# Altium footprint library 封装库.PcbLib: 755 footprints (part 26 of 48)
Each footprint in its own frame and in the unit in brackets; x right, y up, seen from the top. Pads: shape width x height; smd on the part's side, far side on the other; paste and mask are expansions set on the pad; w line width, h text height; cw(c..) or ccw(c..) is an arc to the next point about the centre after c.
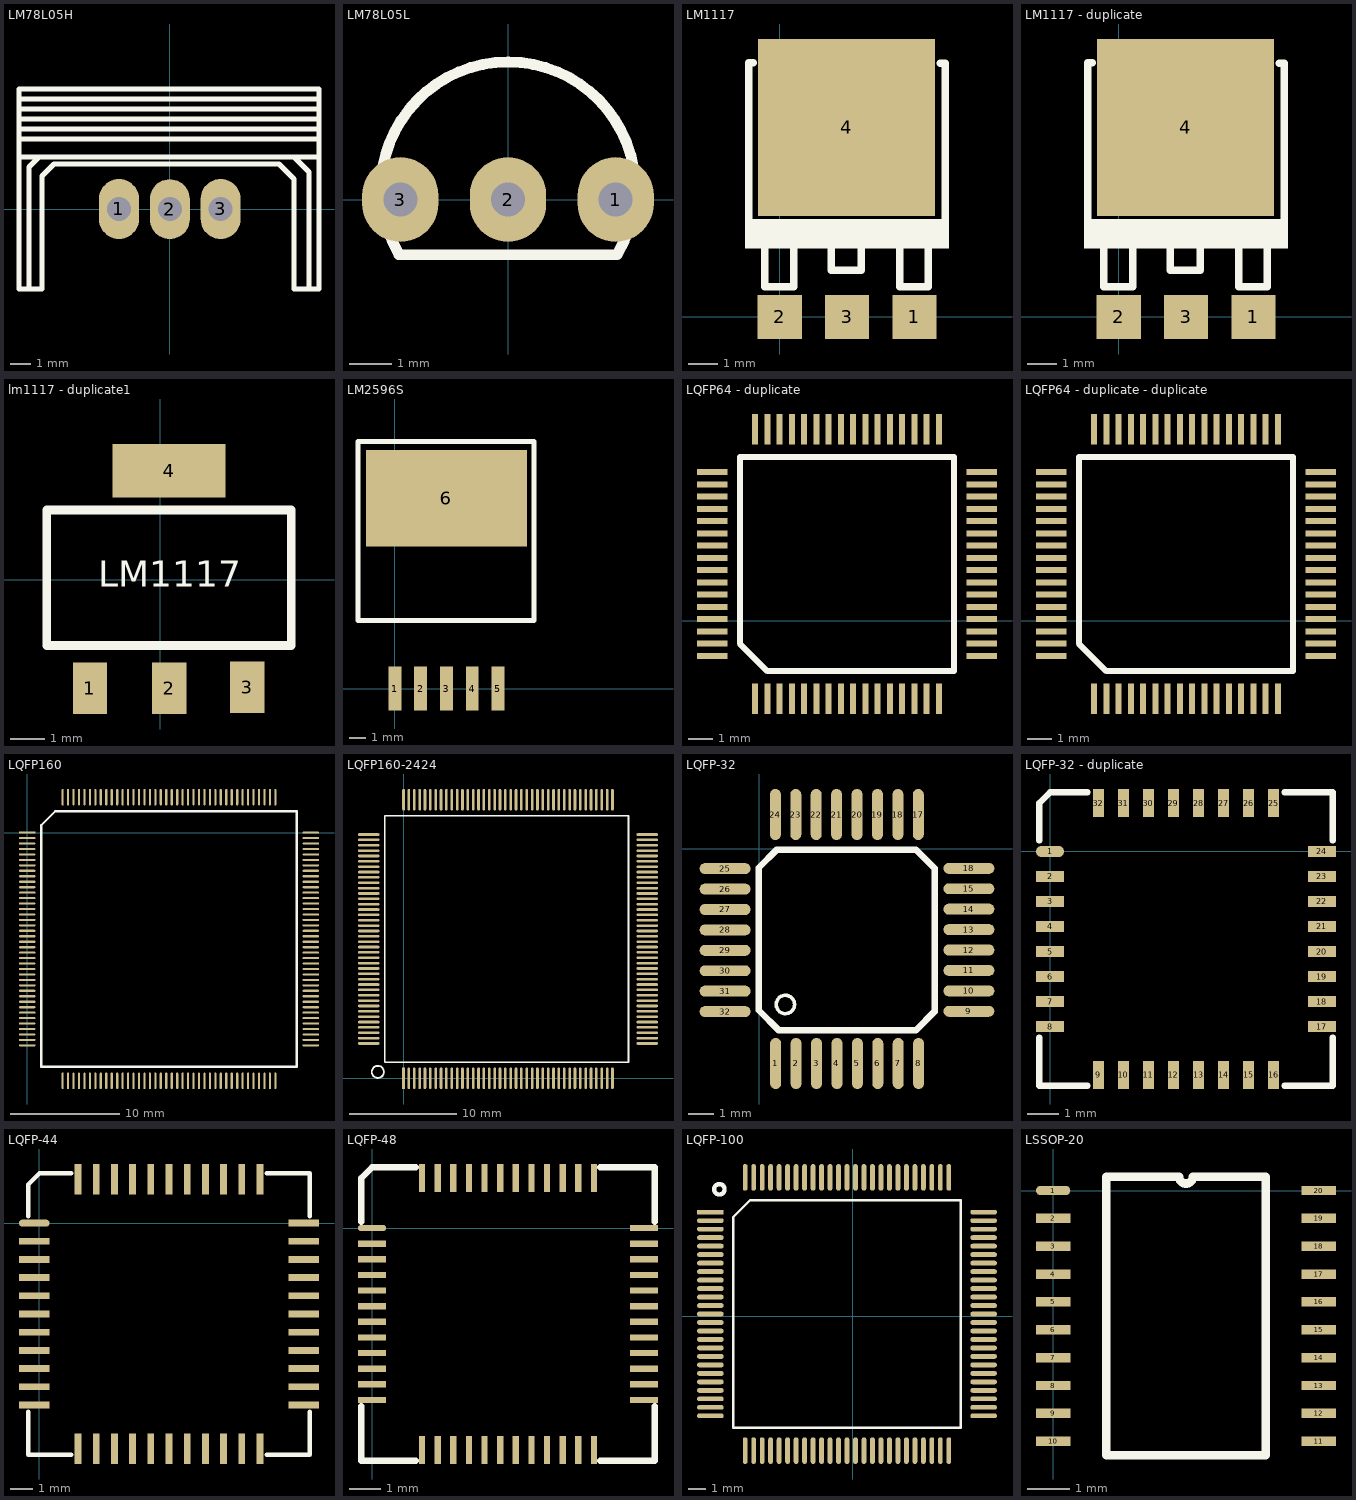
[diagram p25: the footprints below, top view; thin cyan lines are the x and y axes]

## LM78L05H [mm]
pads (3):
  oval 2x3 hole 1.2: 1(-2.544,0.006) 2(0,0) 3(2.536,0.006)
Top Overlay:
  lines w0.254: -7.544,2.61 7.456,2.61 ; -7.544,3.506 7.456,3.506 ; -7.544,4.006 7.456,4.006 ; -7.544,4.506 7.456,4.506 ; -7.544,5.006 7.456,5.006 ; -7.544,5.506 7.456,5.506 ; -7.044,-3.994 -7.044,2.11 -6.544,2.61 ; 6.206,2.61 6.956,1.86 6.956,-3.994 ; -7.544,-3.994 -7.544,6.006 7.456,6.006 7.456,-3.994 6.206,-3.994 6.206,1.506 5.456,2.256 -5.794,2.256 -6.392,1.658 -6.392,-3.994 -7.544,-3.994

## LM78L05L [mm]
pads (3):
  oval 1.8x2 hole 0.8: 1(2.54,0) 2(0,0) 3(-2.54,0)
Top Overlay:
  lines w0.254: -2.594,-1.25 cw(c0.004,0.25) 2.602,-1.25 ; -2.576,-1.3 2.574,-1.3

## LM1117 [mm]
pads (4):
  rect 1.5x1.5 smd: 1(4.572,0) 2(0,0) 3(2.286,0)
  rect 6x6 smd: 4(2.272,6.425)
Top Overlay:
  rectangle: -1.178,2.325 5.747,3.325
  lines w0.254: -1.053,3.15 -1.053,8.625 ; -1.028,8.625 -0.903,8.625 ; -0.503,2.275 -0.503,1.025 0.472,1.025 0.472,2.3 ; 1.747,2.275 1.747,1.575 2.772,1.575 2.772,2.375 ; 4.072,2.275 4.072,1.025 5.047,1.025 5.047,2.3 ; 5.447,8.6 5.597,8.6 ; 5.622,3.175 5.622,8.6

## LM1117 - duplicate [mm]
height 12.93
pads (4):
  rect 1.5x1.5 smd: 1(4.572,0) 2(0,0) 3(2.286,0)
  rect 6x6 smd: 4(2.272,6.425)
Top Overlay:
  rectangle: -1.178,2.325 5.747,3.325
  lines w0.254: -1.053,3.15 -1.053,8.625 ; -1.028,8.625 -0.903,8.625 ; -0.503,2.275 -0.503,1.025 0.472,1.025 0.472,2.3 ; 1.747,2.275 1.747,1.575 2.772,1.575 2.772,2.375 ; 4.072,2.275 4.072,1.025 5.047,1.025 5.047,2.3 ; 5.447,8.6 5.597,8.6 ; 5.622,3.175 5.622,8.6

## lm1117 - duplicate1 [mm]
pads (4):
  rect 1x1.5 smd: 1(-2.043,-3.148) 2(0.256,-3.148) 3(2.53,-3.123)
  rect 3.3x1.549 smd: 4(0.254,3.175)
Top Overlay:
  lines w0.254: -3.302,-1.905 3.81,-1.905 3.81,2.032 -3.302,2.032 -3.302,-1.905
  text "LM1117" at -1.8,-0.2 h0.76

## LM2596S [mm]
pads (6):
  rect 0.8x2.7 smd: 1(0,0) 2(1.6,0) 3(3.2,0) 4(4.8,0) 5(6.4,0)
  rect 10x6 smd: 6(3.2,11.8)
Top Overlay:
  lines w0.305: -2.286,4.208 -2.286,15.333 8.636,15.333 8.636,4.208 -2.286,4.208
Bottom Paste:
  lines w0.254: 6.328,2.091 16.328,2.091 16.328,6.391 6.328,6.391 6.328,2.091
Multi-Layer:
  text "Comment" at -1.927,15.003 h0.64

## LQFP64 - duplicate [mil]
pads (64):
  rect 10x50 smd: 1(848.22,-127.07) 2(868.22,-127.07) 3(888.22,-127.07) 4(908.22,-127.07) 5(928.22,-127.07) 6(948.22,-127.07) 7(968.22,-127.07) 8(988.22,-127.07) 9(1008.22,-127.07) 10(1028.22,-127.07) 11(1048.22,-127.07) 12(1068.22,-127.07) 13(1088.22,-127.07) 14(1108.22,-127.07) 15(1128.22,-127.07) 16(1148.22,-127.07) 33(1148.22,312.93) 34(1128.22,312.93) 35(1108.22,312.93) 36(1088.22,312.93) 37(1068.22,312.93) 38(1048.22,312.93) 39(1028.22,312.93) 40(1008.22,312.93) 41(988.22,312.93) 42(968.22,312.93) 43(948.22,312.93) 44(928.22,312.93) 45(908.22,312.93) 46(888.22,312.93) 47(868.22,312.93) 48(848.22,312.93)
  rect 50x10 smd: 17(1218.22,-57.07) 18(1218.22,-37.07) 19(1218.22,-17.07) 20(1218.22,2.93) 21(1218.22,22.93) 22(1218.22,42.93) 23(1218.22,62.93) 24(1218.22,82.93) 25(1218.22,102.93) 26(1218.22,122.93) 27(1218.22,142.93) 28(1218.22,162.93) 29(1218.22,182.93) 30(1218.22,202.93) 31(1218.22,222.93) 32(1218.22,242.93) 49(778.22,242.93) 50(778.22,222.93) 51(778.22,202.93) 52(778.22,182.93) 53(778.22,162.93) 54(778.22,142.93) 55(778.22,122.93) 56(778.22,102.93) 57(778.22,82.93) 58(778.22,62.93) 59(778.22,42.93) 60(778.22,22.93) 61(778.22,2.93) 62(778.22,-17.07) 63(778.22,-37.07) 64(778.22,-57.07)
Top Overlay:
  lines w10: 823.22,-37.07 868.22,-82.07 1173.22,-82.07 1173.22,267.93 823.22,267.93 823.22,-37.07

## LQFP64 - duplicate - duplicate [mil]
pads (64):
  rect 10x50 smd: 1(848.22,-127.07) 2(868.22,-127.07) 3(888.22,-127.07) 4(908.22,-127.07) 5(928.22,-127.07) 6(948.22,-127.07) 7(968.22,-127.07) 8(988.22,-127.07) 9(1008.22,-127.07) 10(1028.22,-127.07) 11(1048.22,-127.07) 12(1068.22,-127.07) 13(1088.22,-127.07) 14(1108.22,-127.07) 15(1128.22,-127.07) 16(1148.22,-127.07) 33(1148.22,312.93) 34(1128.22,312.93) 35(1108.22,312.93) 36(1088.22,312.93) 37(1068.22,312.93) 38(1048.22,312.93) 39(1028.22,312.93) 40(1008.22,312.93) 41(988.22,312.93) 42(968.22,312.93) 43(948.22,312.93) 44(928.22,312.93) 45(908.22,312.93) 46(888.22,312.93) 47(868.22,312.93) 48(848.22,312.93)
  rect 50x10 smd: 17(1218.22,-57.07) 18(1218.22,-37.07) 19(1218.22,-17.07) 20(1218.22,2.93) 21(1218.22,22.93) 22(1218.22,42.93) 23(1218.22,62.93) 24(1218.22,82.93) 25(1218.22,102.93) 26(1218.22,122.93) 27(1218.22,142.93) 28(1218.22,162.93) 29(1218.22,182.93) 30(1218.22,202.93) 31(1218.22,222.93) 32(1218.22,242.93) 49(778.22,242.93) 50(778.22,222.93) 51(778.22,202.93) 52(778.22,182.93) 53(778.22,162.93) 54(778.22,142.93) 55(778.22,122.93) 56(778.22,102.93) 57(778.22,82.93) 58(778.22,62.93) 59(778.22,42.93) 60(778.22,22.93) 61(778.22,2.93) 62(778.22,-17.07) 63(778.22,-37.07) 64(778.22,-57.07)
Top Overlay:
  lines w10: 823.22,-37.07 868.22,-82.07 1173.22,-82.07 1173.22,267.93 823.22,267.93 823.22,-37.07

## LQFP160 [mm]
pads (160):
  rect 1.5x0.2 smd: 1(0,0)
  oval 1.5x0.2 smd: 2(0,-0.5) 3(0,-1) 4(0,-1.5) 5(0,-2) 6(0,-2.5) 7(0,-3) 8(0,-3.5) 9(0,-4) 10(0,-4.5) 11(0,-5) 12(0,-5.5) 13(0,-6) 14(0,-6.5) 15(0,-7) 16(0,-7.5) 17(0,-8) 18(0,-8.5) 19(0,-9) 20(0,-9.5) 21(0,-10) 22(0,-10.5) 23(0,-11) 24(0,-11.5) 25(0,-12) 26(0,-12.5) 27(0,-13) 28(0,-13.5) 29(0,-14) 30(0,-14.5) 31(0,-15) 32(0,-15.5) 33(0,-16) 34(0,-16.5) 35(0,-17) 36(0,-17.5) 37(0,-18) 38(0,-18.5) 39(0,-19) 40(0,-19.5) 81(26,-19.5) 82(26,-19) 83(26,-18.5) 84(26,-18) 85(26,-17.5) 86(26,-17) 87(26,-16.5) 88(26,-16) 89(26,-15.5) 90(26,-15) 91(26,-14.5) 92(26,-14) 93(26,-13.5) 94(26,-13) 95(26,-12.5) 96(26,-12) 97(26,-11.5) 98(26,-11) 99(26,-10.5) 100(26,-10) 101(26,-9.5) 102(26,-9) 103(26,-8.5) 104(26,-8) 105(26,-7.5) 106(26,-7) 107(26,-6.5) 108(26,-6) 109(26,-5.5) 110(26,-5) 111(26,-4.5) 112(26,-4) 113(26,-3.5) 114(26,-3) 115(26,-2.5) 116(26,-2) 117(26,-1.5) 118(26,-1) 119(26,-0.5) 120(26,0)
  oval 0.2x1.5 smd: 41(3.25,-22.75) 42(3.75,-22.75) 43(4.25,-22.75) 44(4.75,-22.75) 45(5.25,-22.75) 46(5.75,-22.75) 47(6.25,-22.75) 48(6.75,-22.75) 49(7.25,-22.75) 50(7.75,-22.75) 51(8.25,-22.75) 52(8.75,-22.75) 53(9.25,-22.75) 54(9.75,-22.75) 55(10.25,-22.75) 56(10.75,-22.75) 57(11.25,-22.75) 58(11.75,-22.75) 59(12.25,-22.75) 60(12.75,-22.75) 61(13.25,-22.75) 62(13.75,-22.75) 63(14.25,-22.75) 64(14.75,-22.75) 65(15.25,-22.75) 66(15.75,-22.75) 67(16.25,-22.75) 68(16.75,-22.75) 69(17.25,-22.75) 70(17.75,-22.75) 71(18.25,-22.75) 72(18.75,-22.75) 73(19.25,-22.75) 74(19.75,-22.75) 75(20.25,-22.75) 76(20.75,-22.75) 77(21.25,-22.75) 78(21.75,-22.75) 79(22.25,-22.75) 80(22.75,-22.75) 121(22.75,3.25) 122(22.25,3.25) 123(21.75,3.25) 124(21.25,3.25) 125(20.75,3.25) 126(20.25,3.25) 127(19.75,3.25) 128(19.25,3.25) 129(18.75,3.25) 130(18.25,3.25) 131(17.75,3.25) 132(17.25,3.25) 133(16.75,3.25) 134(16.25,3.25) 135(15.75,3.25) 136(15.25,3.25) 137(14.75,3.25) 138(14.25,3.25) 139(13.75,3.25) 140(13.25,3.25) 141(12.75,3.25) 142(12.25,3.25) 143(11.75,3.25) 144(11.25,3.25) 145(10.75,3.25) 146(10.25,3.25) 147(9.75,3.25) 148(9.25,3.25) 149(8.75,3.25) 150(8.25,3.25) 151(7.75,3.25) 152(7.25,3.25) 153(6.75,3.25) 154(6.25,3.25) 155(5.75,3.25) 156(5.25,3.25) 157(4.75,3.25) 158(4.25,3.25) 159(3.75,3.25) 160(3.25,3.25)
Top Overlay:
  lines w0.2: 1.285,-21.465 1.285,0.68 2.57,1.965 24.715,1.965 24.715,-21.465 1.285,-21.465

## LQFP160-2424 [mm]
pads (160):
  rect 0.25x2 smd: 1(0,0)
  oval 0.25x2 smd: 2(0.5,0) 3(1,0) 4(1.5,0) 5(2,0) 6(2.5,0) 7(3,0) 8(3.5,0) 9(4,0) 10(4.5,0) 11(5,0) 12(5.5,0) 13(6,0) 14(6.5,0) 15(7,0) 16(7.5,0) 17(8,0) 18(8.5,0) 19(9,0) 20(9.5,0) 21(10,0) 22(10.5,0) 23(11,0) 24(11.5,0) 25(12,0) 26(12.5,0) 27(13,0) 28(13.5,0) 29(14,0) 30(14.5,0) 31(15,0) 32(15.5,0) 33(16,0) 34(16.5,0) 35(17,0) 36(17.5,0) 37(18,0) 38(18.5,0) 39(19,0) 40(19.5,0) 81(19.5,26) 82(19,26) 83(18.5,26) 84(18,26) 85(17.5,26) 86(17,26) 87(16.5,26) 88(16,26) 89(15.5,26) 90(15,26) 91(14.5,26) 92(14,26) 93(13.5,26) 94(13,26) 95(12.5,26) 96(12,26) 97(11.5,26) 98(11,26) 99(10.5,26) 100(10,26) 101(9.5,26) 102(9,26) 103(8.5,26) 104(8,26) 105(7.5,26) 106(7,26) 107(6.5,26) 108(6,26) 109(5.5,26) 110(5,26) 111(4.5,26) 112(4,26) 113(3.5,26) 114(3,26) 115(2.5,26) 116(2,26) 117(1.5,26) 118(1,26) 119(0.5,26) 120(0,26)
  oval 2x0.25 smd: 41(22.75,3.25) 42(22.75,3.75) 43(22.75,4.25) 44(22.75,4.75) 45(22.75,5.25) 46(22.75,5.75) 47(22.75,6.25) 48(22.75,6.75) 49(22.75,7.25) 50(22.75,7.75) 51(22.75,8.25) 52(22.75,8.75) 53(22.75,9.25) 54(22.75,9.75) 55(22.75,10.25) 56(22.75,10.75) 57(22.75,11.25) 58(22.75,11.75) 59(22.75,12.25) 60(22.75,12.75) 61(22.75,13.25) 62(22.75,13.75) 63(22.75,14.25) 64(22.75,14.75) 65(22.75,15.25) 66(22.75,15.75) 67(22.75,16.25) 68(22.75,16.75) 69(22.75,17.25) 70(22.75,17.75) 71(22.75,18.25) 72(22.75,18.75) 73(22.75,19.25) 74(22.75,19.75) 75(22.75,20.25) 76(22.75,20.75) 77(22.75,21.25) 78(22.75,21.75) 79(22.75,22.25) 80(22.75,22.75) 121(-3.25,22.75) 122(-3.25,22.25) 123(-3.25,21.75) 124(-3.25,21.25) 125(-3.25,20.75) 126(-3.25,20.25) 127(-3.25,19.75) 128(-3.25,19.25) 129(-3.25,18.75) 130(-3.25,18.25) 131(-3.25,17.75) 132(-3.25,17.25) 133(-3.25,16.75) 134(-3.25,16.25) 135(-3.25,15.75) 136(-3.25,15.25) 137(-3.25,14.75) 138(-3.25,14.25) 139(-3.25,13.75) 140(-3.25,13.25) 141(-3.25,12.75) 142(-3.25,12.25) 143(-3.25,11.75) 144(-3.25,11.25) 145(-3.25,10.75) 146(-3.25,10.25) 147(-3.25,9.75) 148(-3.25,9.25) 149(-3.25,8.75) 150(-3.25,8.25) 151(-3.25,7.75) 152(-3.25,7.25) 153(-3.25,6.75) 154(-3.25,6.25) 155(-3.25,5.75) 156(-3.25,5.25) 157(-3.25,4.75) 158(-3.25,4.25) 159(-3.25,3.75) 160(-3.25,3.25)
Top Overlay:
  circle w0.178: c-2.4,0.6 r0.566
  lines w0.178: -1.75,1.5 21,1.5 21,24.5 -1.75,24.5 -1.75,1.5

## LQFP-32 [mm] "STC12C2052AD"
height 0.041
pads (32):
  oval 0.43x2 smd: 1(0.635,-8.407) 2(1.435,-8.407) 3(2.235,-8.407) 4(3.035,-8.407) 5(3.835,-8.407) 6(4.635,-8.407) 7(5.435,-8.407) 8(6.235,-8.407) 17(6.222,1.346) 18(5.422,1.346) 19(4.622,1.346) 20(3.822,1.346) 21(3.022,1.346) 22(2.222,1.346) 23(1.422,1.346) 24(0.622,1.346)
  oval 2x0.43 smd: 9(8.204,-6.362) 10(8.204,-5.562) 11(8.204,-4.762) 12(8.204,-3.962) 13(8.204,-3.162) 14(8.204,-2.362) 15(8.204,-1.562) 18(8.204,-0.762) 25(-1.346,-0.775) 26(-1.346,-1.575) 27(-1.346,-2.375) 28(-1.346,-3.175) 29(-1.346,-3.975) 30(-1.346,-4.775) 31(-1.346,-5.575) 32(-1.346,-6.375)
Top Overlay:
  circle w0.14: c1.016,-6.096 r0.359
  lines w0.254: -0.025,-6.325 -0.025,-0.737 0.686,-0.025 6.121,-0.025 6.858,-0.762 6.858,-6.375 6.121,-7.112 0.762,-7.112 -0.025,-6.325
3D body: height 1, standoff 0, extent -0.051,-7.137 6.858,-0.025
3D body: height 0.5, standoff 0, extent 6.883,-0.876 8.306,-0.648

## LQFP-32 - duplicate [mm] "stc"
pads (32):
  oval 0.9x0.35 smd: 1(0,0)
  rect 0.9x0.35 smd: 2(0,-0.8) 3(0,-1.6) 4(0,-2.4) 5(0,-3.2) 6(0,-4) 7(0,-4.8) 8(0,-5.6) 17(8.7,-5.6) 18(8.7,-4.8) 19(8.7,-4) 20(8.7,-3.2) 21(8.7,-2.4) 22(8.7,-1.6) 23(8.7,-0.8) 24(8.7,0)
  rect 0.35x0.9 smd: 9(1.55,-7.15) 10(2.35,-7.15) 11(3.15,-7.15) 12(3.95,-7.15) 13(4.75,-7.15) 14(5.55,-7.15) 15(6.35,-7.15) 16(7.15,-7.15) 25(7.15,1.55) 26(6.35,1.55) 27(5.55,1.55) 28(4.75,1.55) 29(3.95,1.55) 30(3.15,1.55) 31(2.35,1.55) 32(1.55,1.55)
Top Overlay:
  lines w0.2: -0.35,-5.95 -0.35,-7.5 1.2,-7.5 ; -0.35,0.35 -0.35,1.55 0,1.9 1.2,1.9 ; 7.5,-7.5 9.05,-7.5 9.05,-5.95 ; 7.5,1.9 9.05,1.9 9.05,0.35

## LQFP-44 [mm] "stc"
pads (44):
  oval 1.346x0.3 smd: 1(-0.229,0)
  rect 1.346x0.3 smd: 2(-0.229,-0.8) 3(-0.229,-1.6) 4(-0.229,-2.4) 5(-0.229,-3.2) 6(-0.229,-4) 7(-0.229,-4.8) 8(-0.229,-5.6) 9(-0.229,-6.4) 10(-0.229,-7.2) 11(-0.229,-8) 23(11.629,-8) 24(11.629,-7.2) 25(11.629,-6.4) 26(11.629,-5.6) 27(11.629,-4.8) 28(11.629,-4) 29(11.629,-3.2) 30(11.629,-2.4) 31(11.629,-1.6) 32(11.629,-0.8) 33(11.629,0)
  rect 0.3x1.346 smd: 12(1.7,-9.929) 13(2.5,-9.929) 14(3.3,-9.929) 15(4.1,-9.929) 16(4.9,-9.929) 17(5.7,-9.929) 18(6.5,-9.929) 19(7.3,-9.929) 20(8.1,-9.929) 21(8.9,-9.929) 22(9.7,-9.929) 34(9.7,1.929) 35(8.9,1.929) 36(8.1,1.929) 37(7.3,1.929) 38(6.5,1.929) 39(5.7,1.929) 40(4.9,1.929) 41(4.1,1.929) 42(3.3,1.929) 43(2.5,1.929) 44(1.7,1.929)
Top Overlay:
  lines w0.2: -0.5,-8.3 -0.5,-10.2 1.4,-10.2 ; -0.5,0.3 -0.5,1.7 0,2.2 1.4,2.2 ; 10,-10.2 11.9,-10.2 11.9,-8.3 ; 10,2.2 11.9,2.2 11.9,0.3

## LQFP-48 [mm] "stc"
pads (48):
  oval 0.9x0.2 smd: 1(0,0)
  rect 0.9x0.2 smd: 2(0,-0.5) 3(0,-1) 4(0,-1.5) 5(0,-2) 6(0,-2.5) 7(0,-3) 8(0,-3.5) 9(0,-4) 10(0,-4.5) 11(0,-5) 12(0,-5.5) 25(8.7,-5.5) 26(8.7,-5) 27(8.7,-4.5) 28(8.7,-4) 29(8.7,-3.5) 30(8.7,-3) 31(8.7,-2.5) 32(8.7,-2) 33(8.7,-1.5) 34(8.7,-1) 35(8.7,-0.5) 36(8.7,0)
  rect 0.2x0.9 smd: 13(1.6,-7.1) 14(2.1,-7.1) 15(2.6,-7.1) 16(3.1,-7.1) 17(3.6,-7.1) 18(4.1,-7.1) 19(4.6,-7.1) 20(5.1,-7.1) 21(5.6,-7.1) 22(6.1,-7.1) 23(6.6,-7.1) 24(7.1,-7.1) 37(7.1,1.6) 38(6.6,1.6) 39(6.1,1.6) 40(5.6,1.6) 41(5.1,1.6) 42(4.6,1.6) 43(4.1,1.6) 44(3.6,1.6) 45(3.1,1.6) 46(2.6,1.6) 47(2.1,1.6) 48(1.6,1.6)
Top Overlay:
  lines w0.2: -0.35,-5.7 -0.35,-7.45 1.4,-7.45 ; -0.35,0.2 -0.35,1.6 0,1.95 1.4,1.95 ; 7.3,-7.45 9.05,-7.45 9.05,-5.7 ; 7.3,1.95 9.05,1.95 9.05,0.2

## LQFP-100 [mil]
pads (100):
  rect 62x11.02 smd: 1(-330,241)
  oval 62x11.02 smd: 2(-330,221.31) 3(-330,201.63) 4(-330,181.94) 5(-330,162.26) 6(-330,142.57) 7(-330,122.89) 8(-330,103.2) 9(-330,83.52) 10(-330,63.84) 11(-330,44.15) 12(-330,24.46) 13(-330,4.78) 14(-330,-14.9) 15(-330,-34.59) 16(-330,-54.27) 17(-330,-73.96) 18(-330,-93.64) 19(-330,-113.33) 20(-330,-133.01) 21(-330,-152.7) 22(-330,-172.38) 23(-330,-192.07) 24(-330,-211.75) 25(-330,-231.44) 51(303.87,-231.44) 52(303.87,-211.75) 53(303.87,-192.07) 54(303.87,-172.38) 55(303.87,-152.7) 56(303.87,-133.01) 57(303.87,-113.33) 58(303.87,-93.64) 59(303.87,-73.96) 60(303.87,-54.27) 61(303.87,-34.59) 62(303.87,-14.9) 63(303.87,4.78) 64(303.87,24.46) 65(303.87,44.15) 66(303.87,63.84) 67(303.87,83.52) 68(303.87,103.2) 69(303.87,122.89) 70(303.87,142.57) 71(303.87,162.26) 72(303.87,181.94) 73(303.87,201.63) 74(303.87,221.31) 75(303.87,241)
  oval 11.02x62 smd: 26(-249.28,-312.16) 27(-229.6,-312.16) 28(-209.91,-312.16) 29(-190.23,-312.16) 30(-170.54,-312.16) 31(-150.86,-312.16) 32(-131.17,-312.16) 33(-111.49,-312.16) 34(-91.8,-312.16) 35(-72.12,-312.16) 36(-52.43,-312.16) 37(-32.75,-312.16) 38(-13.06,-312.16) 39(6.62,-312.16) 40(26.31,-312.16) 41(45.99,-312.16) 42(65.68,-312.16) 43(85.36,-312.16) 44(105.05,-312.16) 45(124.73,-312.16) 46(144.42,-312.16) 47(164.1,-312.16) 48(183.79,-312.16) 49(203.47,-312.16) 50(223.16,-312.16) 76(223.16,321.72) 77(203.47,321.72) 78(183.79,321.72) 79(164.1,321.72) 80(144.42,321.72) 81(124.73,321.72) 82(105.05,321.72) 83(85.36,321.72) 84(65.68,321.72) 85(45.99,321.72) 86(26.31,321.72) 87(6.62,321.72) 88(-13.06,321.72) 89(-32.75,321.72) 90(-52.43,321.72) 91(-72.12,321.72) 92(-91.8,321.72) 93(-111.49,321.72) 94(-131.17,321.72) 95(-150.86,321.72) 96(-170.54,321.72) 97(-190.23,321.72) 98(-209.91,321.72) 99(-229.6,321.72) 100(-249.28,321.72)
Top Overlay:
  circle w10: c-309.17,294 r12.16
  lines w5.91: -277.24,-259.39 -277.24,229.19 -237.47,268.95 251.11,268.95 251.11,-259.39 -277.24,-259.39

## LSSOP-20 [mm] "stc"
pads (20):
  oval 0.8x0.22 smd: 1(0,0)
  rect 0.8x0.22 smd: 2(0,-0.65) 3(0,-1.3) 4(0,-1.95) 5(0,-2.6) 6(0,-3.25) 7(0,-3.9) 8(0,-4.55) 9(0,-5.2) 10(0,-5.85) 11(6.2,-5.85) 12(6.2,-5.2) 13(6.2,-4.55) 14(6.2,-3.9) 15(6.2,-3.25) 16(6.2,-2.6) 17(6.2,-1.95) 18(6.2,-1.3) 19(6.2,-0.65) 20(6.2,0)
Top Overlay:
  lines w0.2: 1.235,-6.175 1.235,0.325 2.937,0.325 ccw(c3.1,0.325) 3.262,0.325 4.965,0.325 4.965,-6.175 1.235,-6.175